# Altium footprint library GBA.PcbLib: 110 footprints (part 2 of 7)
Each footprint in its own frame and in the unit in brackets; x right, y up, seen from the top. Pads: shape width x height; smd on the part's side, far side on the other; paste and mask are expansions set on the pad; w line width, h text height; cw(c..) or ccw(c..) is an arc to the next point about the centre after c.
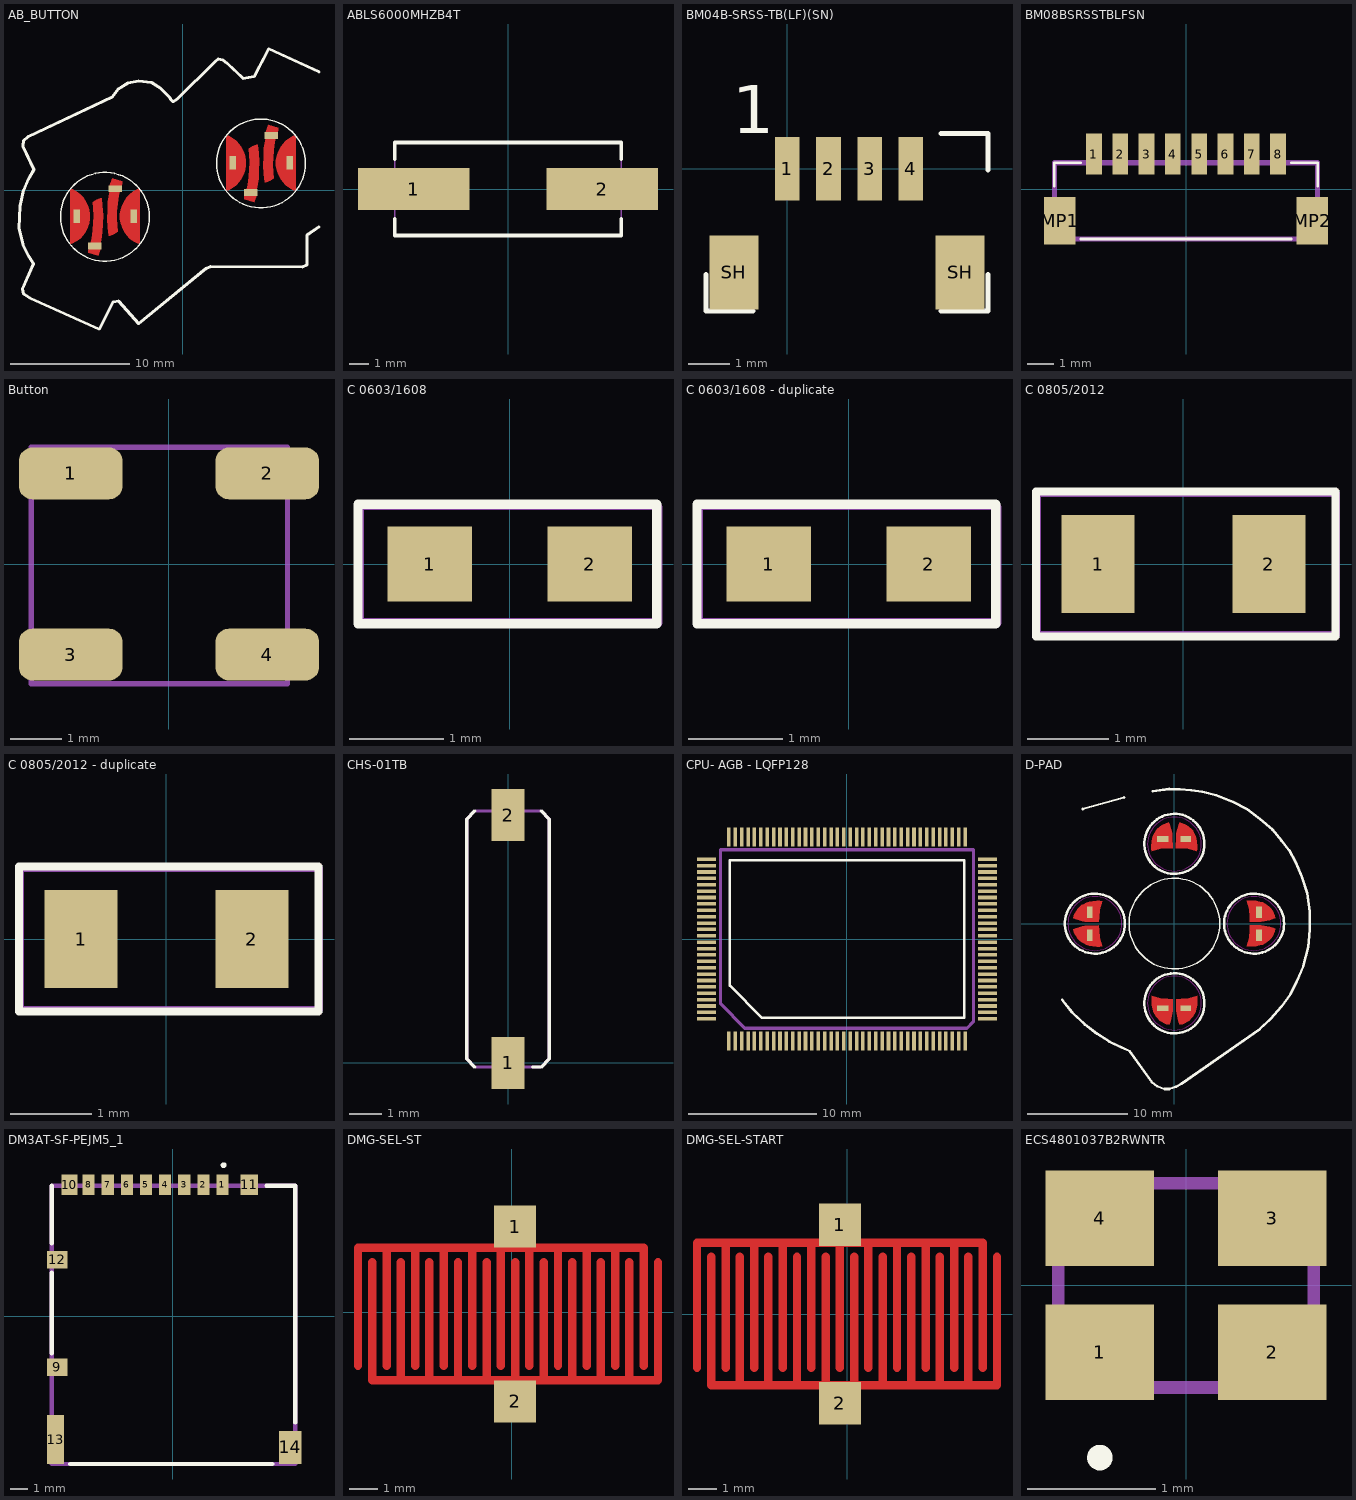
[diagram p1: the footprints below, top view; thin cyan lines are the x and y axes]

## AB_BUTTON [mm]
pads (8):
  rect 0.575x1.149 smd paste-1: A_1(4.182,2.298) A_2(8.961,2.298) B_1(-8.915,-2.183) B_2(-4.136,-2.183)
  rect 1.149x0.575 smd paste-1: A_1(7.422,4.595) A_2(5.698,-0.207) B_1(-5.675,0.115) B_2(-7.399,-4.687)
Top Layer:
  region: -7.95,-5.262 -7.123,-5.491 -6.916,-4.894 -6.985,-4.733 -6.87,-4.182 -6.755,-3.538 -6.732,-2.849 -6.709,-2.091 -6.755,-1.333 -6.824,-0.689 -6.962,-0.689 -7.261,-0.804 -7.56,-1.011 -7.536,-1.539 -7.49,-2.137 -7.514,-2.734 -7.582,-3.378 -7.674,-4.09 -7.766,-4.503 -7.927,-4.71
  region: -5.101,0.758 -5.928,0.988 -6.135,0.391 -6.066,0.23 -6.181,-0.322 -6.296,-0.965 -6.319,-1.654 -6.342,-2.412 -6.296,-3.171 -6.227,-3.814 -6.089,-3.814 -5.79,-3.699 -5.491,-3.492 -5.515,-2.964 -5.561,-2.367 -5.537,-1.769 -5.469,-1.126 -5.377,-0.414 -5.285,0 -5.124,0.207
  region: -9.451,0.134 -9.451,-4.546 -9.272,-4.481 -8.937,-4.298 -8.634,-4.066 -8.37,-3.791 -8.151,-3.479 -7.982,-3.137 -7.867,-2.773 -7.809,-2.397 -7.809,-2.015 -7.867,-1.638 -7.982,-1.275 -8.151,-0.933 -8.37,-0.621 -8.634,-0.345 -8.937,-0.114 -9.272,0.069
  region: -3.646,-4.546 -3.646,0.134 -3.825,0.069 -4.16,-0.114 -4.463,-0.345 -4.727,-0.621 -4.946,-0.933 -5.115,-1.275 -5.23,-1.638 -5.288,-2.015 -5.288,-2.397 -5.23,-2.773 -5.115,-3.137 -4.946,-3.479 -4.727,-3.791 -4.463,-4.066 -4.16,-4.298 -3.825,-4.481
  region: 5.147,-0.781 5.974,-1.011 6.181,-0.414 6.112,-0.253 6.227,0.299 6.342,0.942 6.365,1.631 6.388,2.39 6.342,3.148 6.273,3.791 6.135,3.791 5.836,3.676 5.537,3.47 5.561,2.941 5.607,2.344 5.583,1.746 5.515,1.103 5.423,0.391 5.331,-0.023 5.17,-0.23
  region: 7.996,5.239 7.169,5.469 6.962,4.871 7.031,4.71 6.916,4.159 6.801,3.516 6.778,2.826 6.755,2.068 6.801,1.31 6.87,0.666 7.008,0.666 7.307,0.781 7.606,0.988 7.582,1.516 7.536,2.114 7.56,2.711 7.628,3.355 7.72,4.067 7.812,4.481 7.973,4.687
  region: 3.646,4.615 3.646,-0.065 3.825,0 4.16,0.183 4.463,0.414 4.727,0.689 4.946,1.002 5.115,1.343 5.23,1.707 5.288,2.084 5.288,2.465 5.23,2.842 5.115,3.206 4.946,3.548 4.727,3.86 4.463,4.135 4.16,4.367 3.825,4.55
  region: 9.451,-0.065 9.451,4.615 9.272,4.55 8.937,4.367 8.634,4.135 8.37,3.86 8.151,3.548 7.982,3.206 7.867,2.842 7.809,2.465 7.809,2.084 7.867,1.707 7.982,1.343 8.151,1.002 8.37,0.689 8.634,0.414 8.937,0.183 9.272,0
Top Overlay:
  circle w0.127: c6.548,2.24 r3.727
  circle w0.127: c-6.548,-2.24 r3.727
  lines w0.253: 11.42,-3.079 10.409,-3.768 10.409,-6.296 10.018,-6.457 2.321,-6.411 1.953,-6.571 -3.722,-11.213 -5.4,-9.329 -5.859,-9.375 -7.031,-11.672 -12.821,-9.076 -13.396,-8.708 -13.488,-8.318 -12.546,-6.181 -12.982,-5.491 -13.442,-4.549 -13.763,-3.194 -13.671,-1.356 -13.373,0 -12.982,0.896 -12.5,1.723 -13.442,3.699 -13.396,4.159 -13.005,4.481 -5.951,7.812 -5.446,8.479 -4.618,8.984 -3.722,9.145 -2.642,9.03 -1.907,8.57 -1.126,7.789 -1.011,7.582 -0.827,7.422 -0.505,7.628 2.688,10.776 2.987,11.006 3.309,10.937 3.699,10.661 5.055,9.375 5.974,9.535 7.192,11.856 11.42,9.926
Top Solder:
  drawing of 8 lines, arcs and shapes, not listed
Top Designator:
  text ".Designator" at -3.425,-0.134 h1

## ABLS6000MHZB4T [mm]
pads (2):
  rect 5.6x2.1 smd: 1(-4.75,0) 2(4.75,0)
Top Overlay:
  lines w0.2: -5.7,-1.5 -5.7,-2.35 5.7,-2.35 5.7,-1.5 ; -5.7,1.5 -5.7,2.35 5.7,2.35 5.7,1.5
Top Designator:
  lines w0.1: -5.7,-2.35 5.7,-2.35 5.7,2.35 -5.7,2.35 -5.7,-2.35
  text ".Designator" at -2.286,-0.319 h1
3D body "ABLS-6.000MHZ-B4-T.stp": height 4.3, standoff 0, extent -7.34,-2.35 7.34,2.35

## BM04B-SRSS-TB(LF)(SN) [mm]
pads (6):
  rect 0.6x1.55 smd: 1(0,0) 2(1,0) 3(2,0) 4(3,0)
  rect 1.2x1.8 smd: SH(-1.3,-2.52) SH(4.2,-2.52)
Top Overlay:
  lines w0.127: -1.979,-2.573 -1.979,-3.462 -0.836,-3.462 ; 3.736,-3.462 4.879,-3.462 4.879,-2.573 ; 3.736,0.856 4.879,0.856 4.879,-0.033
  text "1" at -1.344,0.475 h2
3D body "BM04B-SRSS-TB-LF--SN---3DModel-STEP-56544.STEP": height 4.35, standoff 0, extent -1.603,-3.048 4.397,0.552

## BM08BSRSSTBLFSN [mm]
pads (10):
  rect 0.6x1.55 smd: 1(-3.5,1.325) 2(-2.5,1.325) 3(-1.5,1.325) 4(-0.5,1.325) 5(0.5,1.325) 6(1.5,1.325) 7(2.5,1.325) 8(3.5,1.325)
  rect 1.2x1.8 smd: MP1(-4.8,-1.2) MP2(4.8,-1.2)
Top Overlay:
  lines w0.1: -5,0.1 -5,1 -4,1 ; -4,-1.9 4,-1.9 ; 4,1 5,1 5,0.1
Mechanical 13:
  lines w0.2: -5,-1.9 5,-1.9 5,1 -5,1 -5,-1.9
Top Designator (Mech29):
  text ".Designator" at -2.032,-1.143 h1
3D body "BM08B-SRSS-TB.STEP": height 4.3, standoff -0.02, extent -5,-1.778 5,1.822

## Button [mm]
pads (4):
  rrect50% 2x1 smd: 1(-1.9,1.75) 2(1.9,1.75) 3(-1.9,-1.75) 4(1.9,-1.75)
Top Designator (Mech29):
  lines w0.1: -2.662,-2.314 -2.662,2.258 2.291,2.258 2.291,-2.314 -2.662,-2.314
  text ".Designator" at -2.154,-0.409 h1.52
3D body "TL3315NFxxxQ.stp": height 0.6, standoff 0, extent -2.37,-2.278 2.38,2.222

## C 0603/1608 [mm]
pads (2):
  rect 0.9x0.8 smd: 1(-0.85,0) 2(0.85,0)
Top Overlay:
  lines w0.1: -1.612,-0.635 1.563,-0.635 1.563,0.635 -1.612,0.635 -1.612,-0.635
Top Designator (Mech29):
  lines w0.1: -1.6,-0.625 1.575,-0.625 1.575,0.6 1.55,0.625 -1.6,0.625 -1.6,-0.625
  text ".Designator" at -1.4,-0.4 h0.8
3D body: height 0.64, standoff 0, extent 0.85,-0.4 1.3,0.4
3D body: height 0.64, standoff 0, extent -1.3,-0.4 -0.85,0.4
3D body: height 0.64, standoff 0, extent -0.85,-0.4 0.85,0.4

## C 0603/1608 - duplicate [mm]
pads (2):
  rect 0.9x0.8 smd: 1(-0.85,0) 2(0.85,0)
Top Overlay:
  lines w0.1: -1.612,-0.635 -1.612,0.635 1.563,0.635 1.563,-0.635 -1.612,-0.635
Top Designator (Mech29):
  lines w0.1: -1.6,-0.625 -1.6,0.625 1.55,0.625 1.575,0.6 1.575,-0.625 -1.6,-0.625
  text ".Designator" at -1.4,-0.4 h0.8
3D body: height 0.64, standoff 0, extent -0.85,-0.4 0.85,0.4
3D body: height 0.64, standoff 0, extent -1.3,-0.4 -0.85,0.4
3D body: height 0.64, standoff 0, extent 0.85,-0.4 1.3,0.4

## C 0805/2012 [mm]
pads (2):
  rect 0.9x1.2 smd: 1(-1.05,0) 2(1.05,0)
Top Overlay:
  lines w0.1: -1.812,-0.889 -1.812,0.889 1.871,0.889 1.871,-0.889 -1.812,-0.889
Top Designator (Mech29):
  lines w0.1: -1.8,-0.875 -1.8,0.85 -1.775,0.875 1.875,0.875 1.875,-0.875 -1.8,-0.875
  text ".Designator" at -1.675,-0.55 h1
3D body: height 0.64, standoff 0, extent 1.1,-0.6 1.5,0.6
3D body: height 0.64, standoff 0, extent -1.5,-0.6 -1.05,0.6
3D body: height 0.64, standoff 0, extent -1.05,-0.6 1.1,0.6

## C 0805/2012 - duplicate [mm]
pads (2):
  rect 0.9x1.2 smd: 1(-1.05,0) 2(1.05,0)
Top Overlay:
  lines w0.1: -1.812,-0.889 1.871,-0.889 1.871,0.889 -1.812,0.889 -1.812,-0.889
Top Designator (Mech29):
  lines w0.1: -1.8,-0.875 1.875,-0.875 1.875,0.875 -1.775,0.875 -1.8,0.85 -1.8,-0.875
  text ".Designator" at -1.675,-0.55 h1
3D body: height 0.64, standoff 0, extent -1.05,-0.6 1.1,0.6
3D body: height 0.64, standoff 0, extent -1.5,-0.6 -1.05,0.6
3D body: height 0.64, standoff 0, extent 1.1,-0.6 1.5,0.6

## CHS-01TB [mm]
pads (2):
  rect 1x1.6 smd: 1(0,0) 2(0,7.62)
Top Overlay:
  lines w0.1: -1.016,-0.127 -1.27,0.127 -1.27,7.493 -1.016,7.747 ; 0.762,-0.127 1.016,-0.127 1.27,0.127 1.27,7.493 1.016,7.747
Top Designator (Mech29):
  lines w0.1: -1.27,0.127 -1.016,-0.127 1.016,-0.127 1.27,0.127 1.27,7.493 1.016,7.747 -1.016,7.747 -1.27,7.493 -1.27,0.127
  text ".Designator" at 0.254,0.635 h1
3D body "CHS-01TB.stp": height 2.42, standoff -0.1, extent -1.25,-0.19 1.25,7.81

## CPU- AGB - LQFP128 [mm]
pads (128):
  rect 0.28x1.5 smd: 1(-9.25,-8) 2(-8.75,-8) 3(-8.25,-8) 4(-7.75,-8) 5(-7.25,-8) 6(-6.75,-8) 7(-6.25,-8) 8(-5.75,-8) 9(-5.25,-8) 10(-4.75,-8) 11(-4.25,-8) 12(-3.75,-8) 13(-3.25,-8) 14(-2.75,-8) 15(-2.25,-8) 16(-1.75,-8) 17(-1.25,-8) 18(-0.75,-8) 19(-0.25,-8) 20(0.25,-8) 21(0.75,-8) 22(1.25,-8) 23(1.75,-8) 24(2.25,-8) 25(2.75,-8) 26(3.25,-8) 27(3.75,-8) 28(4.25,-8) 29(4.75,-8) 30(5.25,-8) 31(5.75,-8) 32(6.25,-8) 33(6.75,-8) 34(7.25,-8) 35(7.75,-8) 36(8.25,-8) 37(8.75,-8) 38(9.25,-8) 65(9.25,8) 66(8.75,8) 67(8.25,8) 68(7.75,8) 69(7.25,8) 70(6.75,8) 71(6.25,8) 72(5.75,8) 73(5.25,8) 74(4.75,8) 75(4.25,8) 76(3.75,8) 77(3.25,8) 78(2.75,8) 79(2.25,8) 80(1.75,8) 81(1.25,8) 82(0.75,8) 83(0.25,8) 84(-0.25,8) 85(-0.75,8) 86(-1.25,8) 87(-1.75,8) 88(-2.25,8) 89(-2.75,8) 90(-3.25,8) 91(-3.75,8) 92(-4.25,8) 93(-4.75,8) 94(-5.25,8) 95(-5.75,8) 96(-6.25,8) 97(-6.75,8) 98(-7.25,8) 99(-7.75,8) 100(-8.25,8) 101(-8.75,8) 102(-9.25,8)
  rect 1.5x0.28 smd: 39(11,-6.25) 40(11,-5.75) 41(11,-5.25) 42(11,-4.75) 43(11,-4.25) 44(11,-3.75) 45(11,-3.25) 46(11,-2.75) 47(11,-2.25) 48(11,-1.75) 49(11,-1.25) 50(11,-0.75) 51(11,-0.25) 52(11,0.25) 53(11,0.75) 54(11,1.25) 55(11,1.75) 56(11,2.25) 57(11,2.75) 58(11,3.25) 59(11,3.75) 60(11,4.25) 61(11,4.75) 62(11,5.25) 63(11,5.75) 64(11,6.25) 103(-11,6.25) 104(-11,5.75) 105(-11,5.25) 106(-11,4.75) 107(-11,4.25) 108(-11,3.75) 109(-11,3.25) 110(-11,2.75) 111(-11,2.25) 112(-11,1.75) 113(-11,1.25) 114(-11,0.75) 115(-11,0.25) 116(-11,-0.25) 117(-11,-0.75) 118(-11,-1.25) 119(-11,-1.75) 120(-11,-2.25) 121(-11,-2.75) 122(-11,-3.25) 123(-11,-3.75) 124(-11,-4.25) 125(-11,-4.75) 126(-11,-5.25) 127(-11,-5.75) 128(-11,-6.25)
Top Overlay:
  lines w0.2: -9.18,-3.647 -9.18,6.18 9.18,6.18 9.18,-6.18 -6.647,-6.18 -9.18,-3.647
Top Designator:
  lines w0.254: -9.906,-5.08 -9.906,5.715 -9.906,6.985 9.906,6.985 9.906,-6.477 9.398,-6.985 -7.62,-6.985 -8.001,-6.985 -9.906,-5.08
  text ".Designator" at -2.253,-0.226 h1
3D body "User Library-LQFP-144-1.x_t": height 1.55, standoff 0, extent -10.992,-7.991 11.222,8.221

## D-PAD [mm]
pads (8):
  rect 1.039x0.575 smd: DOWN(1.149,-8.444) GND(1.149,8.444)
  rect 0.575x1.149 smd: GND(-8.444,1.149) GND(8.444,-1.149) LEFT(-8.444,-1.149) RIGHT(8.444,1.149)
  rect 1.149x0.575 smd: GND(-1.149,-8.444) UP(-1.149,8.444)
Top Layer:
  region: 0.161,7.548 0.184,8.697 0.207,8.973 0.253,9.225 0.322,9.524 0.437,9.869 0.529,10.099 0.804,10.029 1.034,9.937 1.241,9.823 1.448,9.685 1.677,9.455 1.861,9.248 1.953,9.064 2.091,8.812 2.183,8.513 2.252,8.168 2.275,7.732 2.275,7.433 2.252,7.226 1.402,7.456 0.643,7.525
  region: -0.184,7.548 -0.207,8.697 -0.23,8.973 -0.276,9.225 -0.345,9.524 -0.459,9.869 -0.551,10.099 -0.827,10.029 -1.057,9.937 -1.264,9.823 -1.471,9.685 -1.7,9.455 -1.884,9.248 -1.976,9.064 -2.114,8.812 -2.206,8.513 -2.275,8.168 -2.298,7.732 -2.298,7.433 -2.275,7.226 -1.425,7.456 -0.666,7.525
  region: -0.161,-7.548 -0.184,-8.697 -0.207,-8.973 -0.253,-9.225 -0.322,-9.524 -0.437,-9.869 -0.529,-10.099 -0.804,-10.029 -1.034,-9.937 -1.241,-9.823 -1.448,-9.685 -1.677,-9.455 -1.861,-9.248 -1.953,-9.064 -2.091,-8.812 -2.183,-8.513 -2.252,-8.168 -2.275,-7.732 -2.275,-7.433 -2.252,-7.226 -1.402,-7.456 -0.643,-7.525
  region: 0.184,-7.548 0.207,-8.697 0.23,-8.973 0.276,-9.225 0.345,-9.524 0.459,-9.869 0.551,-10.099 0.827,-10.029 1.057,-9.937 1.264,-9.823 1.471,-9.685 1.7,-9.455 1.884,-9.248 1.976,-9.064 2.114,-8.812 2.206,-8.513 2.275,-8.168 2.298,-7.732 2.298,-7.433 2.275,-7.226 1.425,-7.456 0.666,-7.525
  region: 7.548,-0.161 8.697,-0.184 8.973,-0.207 9.225,-0.253 9.524,-0.322 9.869,-0.437 10.099,-0.529 10.029,-0.804 9.937,-1.034 9.823,-1.241 9.685,-1.448 9.455,-1.677 9.248,-1.861 9.064,-1.953 8.812,-2.091 8.513,-2.183 8.168,-2.252 7.732,-2.275 7.433,-2.275 7.226,-2.252 7.456,-1.402 7.525,-0.643
  region: 7.548,0.184 8.697,0.207 8.973,0.23 9.225,0.276 9.524,0.345 9.869,0.459 10.099,0.551 10.029,0.827 9.937,1.057 9.823,1.264 9.685,1.471 9.455,1.7 9.248,1.884 9.064,1.976 8.812,2.114 8.513,2.206 8.168,2.275 7.732,2.298 7.433,2.298 7.226,2.275 7.456,1.425 7.525,0.666
  region: -7.548,0.161 -8.697,0.184 -8.973,0.207 -9.225,0.253 -9.524,0.322 -9.869,0.437 -10.099,0.529 -10.029,0.804 -9.937,1.034 -9.823,1.241 -9.685,1.448 -9.455,1.677 -9.248,1.861 -9.064,1.953 -8.812,2.091 -8.513,2.183 -8.168,2.252 -7.732,2.275 -7.433,2.275 -7.226,2.252 -7.456,1.402 -7.525,0.643
  region: -7.548,-0.184 -8.697,-0.207 -8.973,-0.23 -9.225,-0.276 -9.524,-0.345 -9.869,-0.459 -10.099,-0.551 -10.029,-0.827 -9.937,-1.057 -9.823,-1.264 -9.685,-1.471 -9.455,-1.7 -9.248,-1.884 -9.064,-1.976 -8.812,-2.114 -8.513,-2.206 -8.168,-2.275 -7.732,-2.298 -7.433,-2.298 -7.226,-2.275 -7.456,-1.425 -7.525,-0.666
Top Layer keep-out:
  circle w0.102: c-7.941,0 r2.693
  circle w0.102: c0,7.941 r2.693
  circle w0.102: c7.941,0 r2.693
  circle w0.102: c0,-7.941 r2.693
Top Overlay:
  circle w0.127: c0,0 r4.527
  circle w0.253: c7.962,0 r2.998
  circle w0.253: c0,7.962 r2.998
  circle w0.253: c-7.941,0 r2.998
  circle w0.253: c0,-7.962 r2.998
  lines w0.253: -11.213,-7.606 -10.202,-8.869 -8.938,-10.087 -7.72,-11.006 -6.48,-11.787 -5.216,-12.408 -4.481,-12.729 -2.252,-15.831 -1.7,-16.268 -0.988,-16.521 -0.529,-16.521 0.161,-16.291 0.712,-15.992 8.524,-10.547 9.605,-9.513 10.684,-8.295 11.58,-7.054 12.224,-5.79 12.89,-4.228 13.373,-2.344 13.534,-0.62 13.511,1.195 13.281,3.033 12.706,4.71 12.109,6.112 11.466,7.33 10.684,8.295 9.788,9.398 8.548,10.455 7.284,11.42 5.813,12.155 4.182,12.821 2.803,13.166 1.677,13.327 0.529,13.419 -0.505,13.442 -2.183,13.212 ; -9.168,11.443 -5.032,12.592
Top Solder:
  drawing of 8 lines, arcs and shapes, not listed
Top Designator:
  text ".Designator" at -1.092,-1.765 h1

## DM3AT-SF-PEJM5_1 [mm]
pads (14):
  rect 0.7x1.2 smd: 1(2.85,7.55) 2(1.75,7.55) 3(0.65,7.55) 4(-0.45,7.55) 5(-1.55,7.55) 6(-2.65,7.55) 7(-3.75,7.55) 8(-4.85,7.55)
  rect 1.2x1 smd: 9(-6.65,-2.95) 12(-6.65,3.25)
  rect 0.9x1.2 smd: 10(-5.95,7.55)
  rect 1x1.2 smd: 11(4.4,7.55)
  rect 1x2.8 smd: 13(-6.75,-7.1)
  rect 1.3x1.9 smd: 14(6.75,-7.55)
Top Overlay:
  circle w0.2: c2.917,8.679 r0.068
  lines w0.254: -6.959,-2.132 -6.959,2.481 ; -6.959,4.19 -6.959,7.493 ; -5.893,-8.507 5.725,-8.507 ; 5.384,7.493 7.041,7.493 7.041,-6.118
Mechanical 13:
  lines w0.254: -6.959,-8.507 -6.959,7.493 7.041,7.493 7.041,-8.507 -6.959,-8.507
Top Designator (Mech29):
  text ".Designator" at -2.667,-1.905 h1
3D body "DM3AT-SF-PEJM5.stp": height 1.68, standoff 0, extent -6.858,-8.53 6.992,7.62

## DMG-SEL-ST [mm]
pads (2):
  rect 1.5x1.5 smd: 1(0.127,3.048) 2(0.127,-3.175)
Top Layer:
  lines w0.3: -5.461,-1.905 -5.461,2.286 4.699,2.286 4.699,-1.905 ; -4.953,1.778 -4.953,-2.413 5.207,-2.413 5.207,1.778 ; -4.445,-1.905 -4.445,2.286 ; -3.937,-2.413 -3.937,1.778 ; -3.429,-1.905 -3.429,2.286 ; -2.921,-2.413 -2.921,1.778 ; -2.413,-1.905 -2.413,2.286 ; -1.905,-2.286 -1.905,1.778 ; -1.397,-1.905 -1.397,2.159 ; -0.889,-2.413 -0.889,1.778 ; -0.381,-1.905 -0.381,2.286 ; 0.127,-2.286 0.127,1.778 ; 0.635,-1.905 0.635,2.286 ; 1.143,-2.286 1.143,1.778 ; 1.651,-1.905 1.651,2.286 ; 2.159,-2.413 2.159,1.778 ; 2.667,-1.905 2.667,2.286 ; 3.175,-2.286 3.175,1.778 ; 3.683,-1.905 3.683,2.286 ; 4.191,-2.413 4.191,1.778

## DMG-SEL-START [mm]
pads (2):
  rect 1.5x1.5 smd: 1(-0.254,3.175) 2(-0.254,-3.175)
Top Layer:
  lines w0.3: -5.334,-1.905 -5.334,2.54 4.826,2.54 4.826,-1.905 ; -4.826,2.032 -4.826,-2.54 5.334,-2.54 5.334,2.032 ; -4.318,-1.905 -4.318,2.54 ; -3.81,-2.54 -3.81,2.032 ; -3.302,-1.905 -3.302,2.54 ; -2.794,-2.54 -2.794,2.032 ; -2.286,-1.905 -2.286,2.54 ; -1.778,-2.54 -1.778,2.032 ; -1.27,-1.905 -1.27,2.54 ; -0.762,-2.54 -0.762,2.032 ; -0.254,-1.905 -0.254,2.54 ; 0.254,-2.54 0.254,2.032 ; 0.762,-1.905 0.762,2.54 ; 1.27,-2.54 1.27,2.032 ; 1.778,-1.905 1.778,2.54 ; 2.286,-2.54 2.286,2.032 ; 2.794,-1.905 2.794,2.54 ; 3.302,-2.54 3.302,2.032 ; 3.81,-1.905 3.81,2.54 ; 4.318,-2.476 4.318,2.032

## ECS4801037B2RWNTR [mm]
pads (4):
  rect 0.85x0.75 smd: 1(-0.675,-0.525) 2(0.675,-0.525) 3(0.675,0.525) 4(-0.675,0.525)
Top Overlay:
  lines w0.1: -0.675,-1.4 cw(c-0.675,-1.35) -0.675,-1.3 cw(c-0.675,-1.35) -0.675,-1.4
Top Designator:
  lines w0.1: -1,-0.524 -1,0.8 1,0.8 1,-0.8 -0.724,-0.8 -1,-0.524
  text ".Designator" at -0.862,-0.473 h1
3D body "ECS-480-10-37B2-RWN-TR.stp": height 0.6, standoff 0, extent -1.025,-0.825 1.025,0.825